# Altium footprint library Integrated Circuits.PcbLib: 142 footprints (part 9 of 9)
Each footprint in its own frame and in the unit in brackets; x right, y up, seen from the top. Pads: shape width x height; smd on the part's side, far side on the other; paste and mask are expansions set on the pad; w line width, h text height; cw(c..) or ccw(c..) is an arc to the next point about the centre after c.
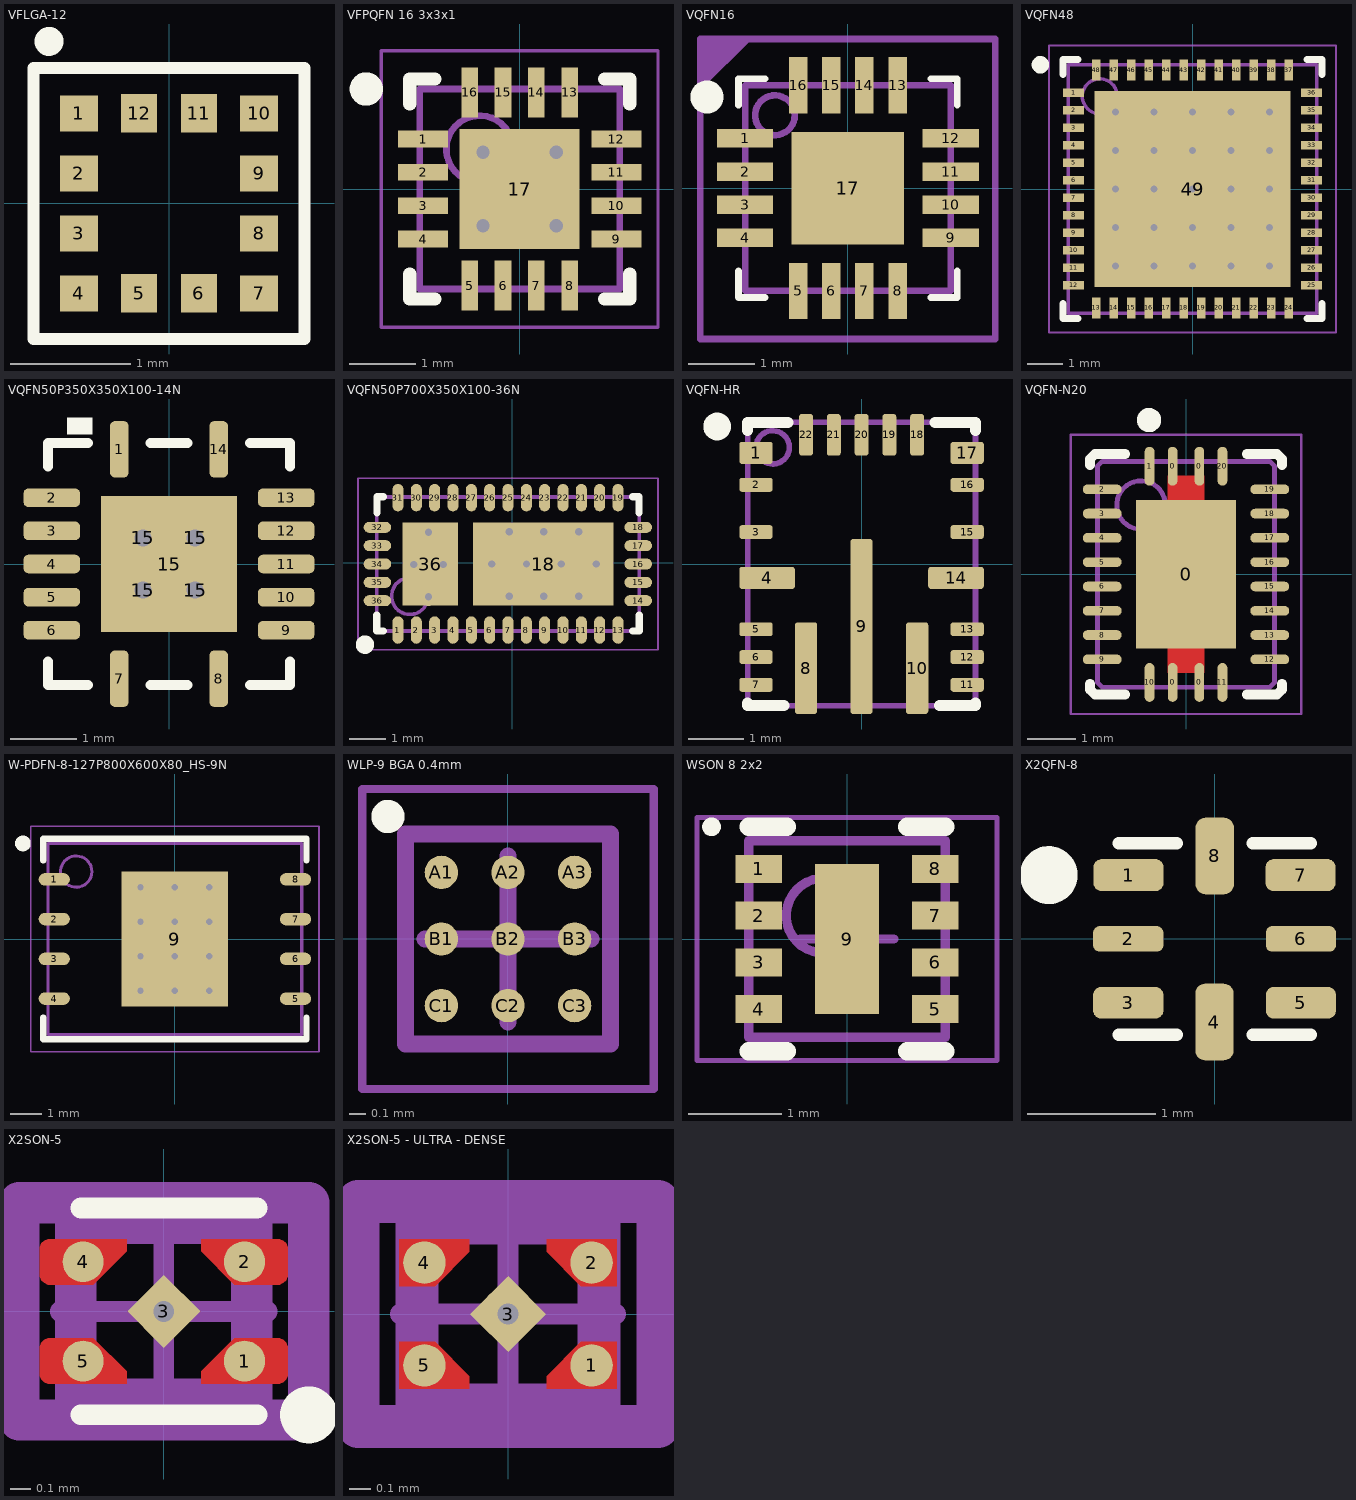
[diagram p8: the footprints below, top view; thin cyan lines are the x and y axes]

## VFLGA-12 [mm] "SENSOR MAGMTR I2C/SPI 12LGA"
height 1
pads (12):
  rect 0.32x0.3 smd: 1(-0.75,0.75) 2(-0.75,0.25) 3(-0.75,-0.25) 4(-0.75,-0.75) 7(0.75,-0.75) 8(0.75,-0.25) 9(0.75,0.25) 10(0.75,0.75)
  rect 0.3x0.32 smd: 5(-0.25,-0.75) 6(0.25,-0.75) 11(0.25,0.75) 12(-0.25,0.75)
Top Overlay:
  circle w0.2: c-1,1.35 r0.02
  lines w0.1: -1.13,-1.13 1.13,-1.13 1.13,1.13 -1.13,1.13 -1.13,-1.13
3D body: height 1, standoff 0, extent -1.075,-1.075 1.075,1.075

## VFPQFN 16 3x3x1 [mm] "STSPIN233"
height 1
pads (17):
  rect 0.75x0.25 smd: 1(-1.45,0.75) 2(-1.45,0.25) 3(-1.45,-0.25) 4(-1.45,-0.75) 9(1.45,-0.75) 10(1.45,-0.25) 11(1.45,0.25) 12(1.45,0.75)
  rect 0.25x0.75 smd: 5(-0.75,-1.45) 6(-0.25,-1.45) 7(0.25,-1.45) 8(0.75,-1.45) 13(0.75,1.45) 14(0.25,1.45) 15(-0.25,1.45) 16(-0.75,1.45)
  rect 1.8x1.8 smd: 17(0,0)
via 0.55,-0.55 diameter 0.5 hole 0.2
via -0.55,-0.55 diameter 0.5 hole 0.2
via 0.55,0.55 diameter 0.5 hole 0.2
via -0.55,0.55 diameter 0.5 hole 0.2
Top Overlay:
  circle w0.25: c-2.3,1.5 r0.125
  lines w0.2: -1.65,-1.275 -1.65,-1.65 -1.275,-1.65 ; -1.65,1.275 -1.65,1.65 -1.275,1.65 ; 1.275,-1.65 1.65,-1.65 1.65,-1.275 ; 1.275,1.65 1.65,1.65 1.65,1.275
3D Bodies:
  circle w0.1: c-0.6,0.6 r0.5
  lines w0.1: -1.5,-1.5 1.5,-1.5 1.5,1.5 -1.5,1.5 -1.5,-1.5
Mechanical 15:
  lines w0.05: -2.075,-2.075 2.075,-2.075 2.075,2.075 -2.075,2.075 -2.075,-2.075
  lines w0.1: -0.5,0 0.5,0 ; 0,-0.5 0,0.5
3D body: height 1, standoff 0, extent -1.5,-1.5 1.5,1.5

## VQFN16 [mm] "16 pin QFN with thermal pad, 3x3mm"
pads (17):
  rect 0.85x0.28 smd: 1(-1.55,0.75) 2(-1.55,0.25) 3(-1.55,-0.25) 4(-1.55,-0.75) 9(1.55,-0.75) 10(1.55,-0.25) 11(1.55,0.25) 12(1.55,0.75)
  rect 0.28x0.85 smd: 5(-0.75,-1.55) 6(-0.25,-1.55) 7(0.25,-1.55) 8(0.75,-1.55) 13(0.75,1.55) 14(0.25,1.55) 15(-0.25,1.55) 16(-0.75,1.55)
  rect 1.7x1.7 smd paste-1: 17(0,0)
Top Overlay:
  circle w0.25: c-2.125,1.375 r0.125
  lines w0.1: -1.65,-1.25 -1.65,-1.65 -1.25,-1.65 ; -1.65,1.25 -1.65,1.65 -1.25,1.65 ; 1.25,-1.65 1.65,-1.65 1.65,-1.25 ; 1.25,1.65 1.65,1.65 1.65,1.25
Top Paste:
  region: 0.8,0.8 0.1,0.8 0.1,0.1 0.8,0.1
  region: -0.1,0.8 -0.8,0.8 -0.8,0.1 -0.1,0.1
  region: -0.1,-0.1 -0.8,-0.1 -0.8,-0.8 -0.1,-0.8
  region: 0.8,-0.1 0.1,-0.1 0.1,-0.8 0.8,-0.8
Top Assy Drawing:
  region: -2.2,1.5 -1.45,2.25 -2.2,2.25
3D Bodies:
  circle w0.1: c-1.1,1.1 r0.3
  lines w0.1: -1.55,-1.55 1.55,-1.55 1.55,1.55 -1.55,1.55 -1.55,-1.55
Mechanical 15:
  lines w0.1: -0.5,0 0.5,0 ; 0,-0.5 0,0.5 ; -2.225,-2.275 2.225,-2.275 2.225,2.25 -2.225,2.25 -2.225,-2.275
  text ".Designator" at -1.956,-0.279 h0.38
3D body "QFN50P300X300X100_HS-17N.step": height 1, standoff 0, extent -1.6,-1.6 1.6,1.6

## VQFN48 [mm] "VQFN, 48-Leads, 7.00x7.00mm, Pitch 0.50mm"
height 1
pads (49):
  rect 0.6x0.24 smd: 1(-3.4,2.75) 2(-3.4,2.25) 3(-3.4,1.75) 4(-3.4,1.25) 5(-3.4,0.75) 6(-3.4,0.25) 7(-3.4,-0.25) 8(-3.4,-0.75) 9(-3.4,-1.25) 10(-3.4,-1.75) 11(-3.4,-2.25) 12(-3.4,-2.75) 25(3.4,-2.75) 26(3.4,-2.25) 27(3.4,-1.75) 28(3.4,-1.25) 29(3.4,-0.75) 30(3.4,-0.25) 31(3.4,0.25) 32(3.4,0.75) 33(3.4,1.25) 34(3.4,1.75) 35(3.4,2.25) 36(3.4,2.75)
  rect 0.24x0.6 smd: 13(-2.75,-3.4) 14(-2.25,-3.4) 15(-1.75,-3.4) 16(-1.25,-3.4) 17(-0.75,-3.4) 18(-0.25,-3.4) 19(0.25,-3.4) 20(0.75,-3.4) 21(1.25,-3.4) 22(1.75,-3.4) 23(2.25,-3.4) 24(2.75,-3.4) 37(2.75,3.4) 38(2.25,3.4) 39(1.75,3.4) 40(1.25,3.4) 41(0.75,3.4) 42(0.25,3.4) 43(-0.25,3.4) 44(-0.75,3.4) 45(-1.25,3.4) 46(-1.75,3.4) 47(-2.25,3.4) 48(-2.75,3.4)
  rect 5.6x5.6 smd: 49(0,0)
via 2.2,-2.2 diameter 0.5 hole 0.2
via 1.1,-2.2 diameter 0.5 hole 0.2
via 0,-2.2 diameter 0.5 hole 0.2
via -1.1,-2.2 diameter 0.5 hole 0.2
via -2.2,-2.2 diameter 0.5 hole 0.2
via 2.2,-1.1 diameter 0.5 hole 0.2
via 1.1,-1.1 diameter 0.5 hole 0.2
via 0,-1.1 diameter 0.5 hole 0.2
via -1.1,-1.1 diameter 0.5 hole 0.2
via -2.2,-1.1 diameter 0.5 hole 0.2
via 2.2,0 diameter 0.5 hole 0.2
via 1.1,0 diameter 0.5 hole 0.2
via 0,0 diameter 0.5 hole 0.2
via -1.1,0 diameter 0.5 hole 0.2
via -2.2,0 diameter 0.5 hole 0.2
via 2.2,1.1 diameter 0.5 hole 0.2
via 1.1,1.1 diameter 0.5 hole 0.2
via 0,1.1 diameter 0.5 hole 0.2
via -1.1,1.1 diameter 0.5 hole 0.2
via -2.2,1.1 diameter 0.5 hole 0.2
via 2.2,2.2 diameter 0.5 hole 0.2
via 1.1,2.2 diameter 0.5 hole 0.2
via 0,2.2 diameter 0.5 hole 0.2
via -1.1,2.2 diameter 0.5 hole 0.2
via -2.2,2.2 diameter 0.5 hole 0.2
Top Overlay:
  circle w0.25: c-4.35,3.55 r0.125
  lines w0.2: -3.7,-3.27 -3.7,-3.7 -3.27,-3.7 ; -3.7,3.27 -3.7,3.7 -3.27,3.7 ; 3.27,-3.7 3.7,-3.7 3.7,-3.27 ; 3.27,3.7 3.7,3.7 3.7,3.27
3D Bodies:
  circle w0.1: c-2.65,2.65 r0.5
  lines w0.1: -3.55,-3.55 3.55,-3.55 3.55,3.55 -3.55,3.55 -3.55,-3.55
Mechanical 15:
  lines w0.05: -4.1,-4.1 4.1,-4.1 4.1,4.1 -4.1,4.1 -4.1,-4.1
  lines w0.1: -0.5,0 0.5,0 ; 0,-0.5 0,0.5
3D body "VQFN48.step": height 1, standoff 0, extent -3.551,-3.551 3.551,3.551

## VQFN50P350X350X100-14N [mm] "VQFN, 14-Leads, Body 3.50x3.50mm, Pitch 0.50mm, IPC Medium Density"
pads (19):
  rrect50% 0.28x0.85 smd paste-0.412: 1(-0.75,1.731) 7(-0.75,-1.731) 8(0.75,-1.731) 14(0.75,1.731)
  rrect50% 0.85x0.28 smd paste-0.412: 2(-1.769,1) 3(-1.769,0.5) 4(-1.769,0) 5(-1.769,-0.5) 6(-1.769,-1) 9(1.769,-1) 10(1.769,-0.5) 11(1.769,0) 12(1.769,0.5) 13(1.769,1)
  round 0.508 / inner round 1.524 / far side round 0.508 hole 0.254: 15(-0.394,-0.394) 15(-0.394,0.394) 15(0.394,0.394)
  rect 2.05x2.05 smd paste-1.012 mask-1.016: 15(0,0)
  round 0.508 hole 0.254: 15(0.394,-0.394)
Top Layer:
  region: 0,-1.025
  region: 0,1.025
Top Overlay:
  region: -1.156,2.21 -1.156,1.956 -1.537,1.956 -1.537,2.21
  lines w0.152: -1.825,-1.473 -1.825,-1.825 -1.223,-1.825 ; -1.825,1.473 -1.825,1.825 -1.223,1.825 ; -0.277,-1.825 0.277,-1.825 ; -0.277,1.825 0.277,1.825 ; 1.223,-1.825 1.825,-1.825 1.825,-1.473 ; 1.223,1.825 1.825,1.825 1.825,1.473
Top Paste:
  drawing of 27 lines, arcs and shapes, not listed
Top Solder:
  region: 0.594,-1.088 0.594,1.088 1.088,1.088 1.088,-1.088
  region: 0.194,-1.088 0.194,1.088 -0.194,1.088 -0.194,-1.088
  region: -1.088,-1.088 -1.088,1.088 -0.594,1.088 -0.594,-1.088
  region: -1.088,-1.088 -1.088,-0.594 1.088,-0.594 1.088,-1.088
  region: -1.088,-0.194 -1.088,0.194 1.088,0.194 1.088,-0.194
  region: -1.088,0.594 -1.088,1.088 1.088,1.088 1.088,0.594
  region: 0,-1.025
  region: 0,1.025
  region: -0.54,2.226 -0.96,2.226 -0.96,1.236 -0.54,1.236
  region: 0.96,2.226 0.54,2.226 0.54,1.236 0.96,1.236
  region: 2.264,1.21 1.274,1.21 1.274,0.79 2.264,0.79
  region: 2.264,0.71 1.274,0.71 1.274,0.29 2.264,0.29
  region: 2.264,0.21 1.274,0.21 1.274,-0.21 2.264,-0.21
  region: 2.264,-0.29 1.274,-0.29 1.274,-0.71 2.264,-0.71
  region: 2.264,-0.79 1.274,-0.79 1.274,-1.21 2.264,-1.21
  region: 0.96,-1.236 0.54,-1.236 0.54,-2.226 0.96,-2.226
  region: -0.54,-1.236 -0.96,-1.236 -0.96,-2.226 -0.54,-2.226
  region: -1.274,-0.79 -2.264,-0.79 -2.264,-1.21 -1.274,-1.21
  region: -1.274,-0.29 -2.264,-0.29 -2.264,-0.71 -1.274,-0.71
  region: -1.274,0.21 -2.264,0.21 -2.264,-0.21 -1.274,-0.21
  region: -1.274,0.71 -2.264,0.71 -2.264,0.29 -1.274,0.29
  region: -1.274,1.21 -2.264,1.21 -2.264,0.79 -1.274,0.79
3D body "RGY0014A.stp": height 0.97, standoff 0, extent -1.769,-1.731 1.731,1.769

## VQFN50P700X350X100-36N [mm] "VQFN, 36-Leads, Body 7.00x3.50mm, Pitch 0.50mm, IPC Medium Density"
height 1
pads (38):
  oval 0.3x0.75 smd: 1(-3.116,-1.834) 2(-2.616,-1.834) 3(-2.116,-1.834) 4(-1.616,-1.834) 5(-1.116,-1.834) 6(-0.616,-1.834) 7(-0.116,-1.834) 8(0.384,-1.834) 9(0.884,-1.834) 10(1.384,-1.834) 11(1.884,-1.834) 12(2.384,-1.834) 13(2.884,-1.834) 19(2.884,1.776) 20(2.384,1.776) 21(1.884,1.776) 22(1.384,1.776) 23(0.884,1.776) 24(0.384,1.776) 25(-0.116,1.776) 26(-0.616,1.776) 27(-1.116,1.776) 28(-1.616,1.776) 29(-2.116,1.776) 30(-2.616,1.776) 31(-3.116,1.776)
  oval 0.75x0.3 smd: 14(3.434,-1.034) 15(3.434,-0.534) 16(3.434,-0.034) 17(3.434,0.466) 18(3.434,0.966) 32(-3.676,0.966) 33(-3.676,0.466) 34(-3.676,-0.034) 35(-3.676,-0.534) 36(-3.676,-1.034)
  rect 3.836x2.25 smd paste+0 mask+0: 18(0.841,-0.034)
  rect 1.514x2.25 smd paste+0 mask+0: 36(-2.234,-0.034)
via -0.087,-0.909 diameter 0.508 hole 0.203
via -0.087,0.841 diameter 0.508 hole 0.203
via 0.863,0.841 diameter 0.508 hole 0.203
via 0.863,-0.909 diameter 0.508 hole 0.203
via 1.813,0.841 diameter 0.508 hole 0.203
via 1.813,-0.909 diameter 0.508 hole 0.203
via 2.288,-0.034 diameter 0.508 hole 0.203
via 1.338,-0.034 diameter 0.508 hole 0.203
via 0.388,-0.034 diameter 0.508 hole 0.203
via -0.562,-0.034 diameter 0.508 hole 0.203
via -1.884,-0.048 diameter 0.508 hole 0.203
via -2.684,-0.048 diameter 0.508 hole 0.203
via -2.284,0.827 diameter 0.508 hole 0.203
via -2.284,-0.923 diameter 0.508 hole 0.203
Top Overlay:
  circle w0.25: c-4.016,-2.234 r0.125
  lines w0.2: -3.696,-1.434 -3.696,-1.859 -3.516,-1.859 ; -3.686,1.366 -3.686,1.796 -3.516,1.796 ; 3.284,-1.859 3.459,-1.859 3.459,-1.434 ; 3.284,1.796 3.454,1.796 3.454,1.366
3D Bodies:
  circle w0.1: c-2.791,-0.909 r0.5
  lines w0.1: -3.691,-1.859 -3.691,1.791 3.459,1.791 3.459,-1.859 -3.691,-1.859
Mechanical 15:
  lines w0.05: -4.206,-2.374 -4.206,2.306 3.974,2.306 3.974,-2.374 -4.206,-2.374
  lines w0.1: -0.616,-0.034 0.384,-0.034 ; -0.116,-0.534 -0.116,0.466
3D body: height 1, standoff 0, extent -3.741,-1.859 3.409,1.791

## VQFN-HR [mm] "LMS3635AQRNLRQ1"
height 0.9
pads (22):
  rrect25% 0.6x0.4 smd paste+0: 1(-1.9,2) 17(1.9,2)
  rrect40% 0.6x0.25 smd paste+0: 2(-1.9,1.425) 3(-1.9,0.575) 5(-1.9,-1.175) 6(-1.9,-1.675) 7(-1.9,-2.175) 11(1.9,-2.175) 12(1.9,-1.675) 13(1.9,-1.175) 15(1.9,0.575) 16(1.9,1.425)
  rrect25% 1x0.4 smd paste-0.2: 4(-1.7,-0.25) 14(1.7,-0.25)
  rrect25% 0.4x1.65 smd paste-0.2: 8(-1,-1.875) 10(1,-1.875)
  rrect25% 0.4x3.15 smd paste-0.2: 9(0,-1.125)
  rrect40% 0.25x0.75 smd paste+0: 18(1,2.325) 19(0.5,2.325) 20(0,2.325) 21(-0.5,2.325) 22(-1,2.325)
Top Overlay:
  circle w0.25: c-2.6,2.475 r0.125
  lines w0.2: -2.05,-2.5 -2.05,-2.55 -1.4,-2.55 ; -2.05,2.4 -2.05,2.55 -1.325,2.55 ; 1.325,2.55 2.05,2.55 2.05,2.4 ; 1.4,-2.55 2.05,-2.55 2.05,-2.5
Top Paste:
  drawing of 12 lines, arcs and shapes, not listed
Top Assy Drawing:
  circle w0.1: c-1.6,2.1 r0.3
  lines w0.1: -2.05,-2.55 -2.05,2.55 2.05,2.55 2.05,-2.55 -2.05,-2.55
  text ".Designator" at -1.95,-0.291 h0.38
Top Dimensions and Assy Info:
  lines w0.05: -1.825,-0.25 -1.575,-0.25 ; -1.7,-0.375 -1.7,-0.125 ; -1.125,-1.875 -0.875,-1.875 ; -1,-2 -1,-1.75 ; -0.125,-1.955 0.125,-1.955 ; -0.125,-1.125 0.125,-1.125 ; -0.125,-0.295 0.125,-0.295 ; 0,-2.08 0,-1.83 ; 0,-1.25 0,-1 ; 0,-0.42 0,-0.17 ; 0.875,-1.875 1.125,-1.875 ; 1,-2 1,-1.75 ; 1.575,-0.25 1.825,-0.25 ; 1.7,-0.375 1.7,-0.125
  text "Vias at crosses 0.2 mm diameter recommended" at -2,-4 h0.25
3D body: height 0.9, standoff 0, extent -2.05,-2.55 2.05,2.55

## VQFN-N20 [mm]
height 0.8
pads (25):
  oval 0.2x0.8 smd: 0(-0.275,-2.225) 0(-0.275,2.225) 0(0.275,-2.225) 0(0.275,2.225) 1(-0.75,2.225) 10(-0.75,-2.225) 11(0.75,-2.225) 20(0.75,2.225)
  rect 2.05x3.05 smd paste-10: 0(0,0)
  oval 0.8x0.2 smd: 2(-1.725,1.75) 3(-1.725,1.25) 4(-1.725,0.75) 5(-1.725,0.25) 6(-1.725,-0.25) 7(-1.725,-0.75) 8(-1.725,-1.25) 9(-1.725,-1.75) 12(1.725,-1.75) 13(1.725,-1.25) 14(1.725,-0.75) 15(1.725,-0.25) 16(1.725,0.25) 17(1.725,0.75) 18(1.725,1.25) 19(1.725,1.75)
Top Layer:
  rectangle: -0.381,-2.032 0.381,2.032
Top Overlay:
  circle w0.25: c-0.762,3.175 r0.125
  lines w0.2: -1.975,-2.25 -1.975,-2.375 -1.875,-2.475 -1.25,-2.475 ; -1.975,2.25 -1.975,2.375 -1.875,2.475 -1.25,2.475 ; 1.25,-2.475 1.875,-2.475 1.975,-2.375 1.975,-2.25 ; 1.25,2.475 1.875,2.475 1.975,2.375 1.975,2.25
Top Paste:
  region: 0.936,-0.116 0.116,-0.116 0.116,-1.436 0.936,-1.436
  rectangle: -0.97,0.15 -0.15,1.47
  region: -0.15,-0.15 -0.97,-0.15 -0.97,-1.47 -0.15,-1.47
  rectangle: 0.15,0.15 0.97,1.47
Top Solder:
  rectangle: -0.483,-2.032 0.483,2.032
Top Assy Drawing:
  text ".Designator" at -0.673,3.824 h0.51
3D Bodies:
  circle w0.1: c-0.925,1.425 r0.5
  lines w0.1: -1.825,-2.225 -1.825,2.225 -1.725,2.325 1.725,2.325 1.825,2.225 1.825,-2.225 1.725,-2.325 -1.725,-2.325 -1.825,-2.225
Mechanical 15:
  lines w0.05: -2.375,-2.875 2.375,-2.875 2.375,2.875 -2.375,2.875 -2.375,-2.875
  lines w0.1: -0.5,0 0.5,0 ; 0,-0.5 0,0.5
3D body "QFN127P600-8N.step": height 0.8, standoff 0, extent -1.835,-2.335 1.835,2.335

## W-PDFN-8-127P800X600X80_HS-9N [mm] "QFN, 8-Leads, Body 8.00x6.00mm, Pitch 1.27mm, Thermal Pad 3.40x4.30mm, IPC Medium Density"
height 0.8
pads (9):
  oval 1x0.4 smd: 1(-3.85,1.905) 2(-3.85,0.635) 3(-3.85,-0.635) 4(-3.85,-1.905) 5(3.85,-1.905) 6(3.85,-0.635) 7(3.85,0.635) 8(3.85,1.905)
  rect 3.4x4.3 smd: 9(0,0)
via -1.1,1.65 diameter 0.5 hole 0.2
via 0,1.65 diameter 0.5 hole 0.2
via 1.1,1.65 diameter 0.5 hole 0.2
via -1.1,0.55 diameter 0.5 hole 0.2
via 0,0.55 diameter 0.5 hole 0.2
via 1.1,0.55 diameter 0.5 hole 0.2
via -1.1,-0.55 diameter 0.5 hole 0.2
via 0,-0.55 diameter 0.5 hole 0.2
via 1.1,-0.55 diameter 0.5 hole 0.2
via -1.1,-1.65 diameter 0.5 hole 0.2
via 0,-1.65 diameter 0.5 hole 0.2
via 1.1,-1.65 diameter 0.5 hole 0.2
Top Overlay:
  circle w0.25: c-4.85,3.05 r0.125
  lines w0.2: -4.2,-2.505 -4.2,-3.2 0.035,-3.2 ; -4.2,2.505 -4.2,3.2 0.035,3.2 ; -0.035,-3.2 4.2,-3.2 4.2,-2.505 ; -0.035,3.2 4.2,3.2 4.2,2.505
3D Bodies:
  circle w0.1: c-3.15,2.15 r0.5
  lines w0.1: -4.05,-3.05 -4.05,3.05 4.05,3.05 4.05,-3.05 -4.05,-3.05
Mechanical 15:
  lines w0.05: -4.6,-3.6 -4.6,3.6 4.6,3.6 4.6,-3.6 -4.6,-3.6
  lines w0.1: -0.5,0 0.5,0 ; 0,-0.5 0,0.5
3D body "QFN127P800X600X80_HS-9N.step": height 0.8, standoff 0, extent -4.051,-3.05 4.051,3.05

## WLP-9 BGA 0.4mm [mm] "9 PIN WLP BGA MAXIM41400ANL"
height 0.5
pads (9):
  round 0.2 smd: A1(-0.4,0.4) A2(0,0.4) A3(0.4,0.4) B1(-0.4,0) B2(0,0) B3(0.4,0) C1(-0.4,-0.4) C2(0,-0.4) C3(0.4,-0.4)
Top Overlay:
  circle w0.1: c-0.72,0.735 r0.05
3D Bodies:
  lines w0.1: -0.615,-0.63 0.615,-0.63 0.615,0.63 -0.615,0.63 -0.615,-0.63
Mechanical 15:
  lines w0.05: -0.875,-0.9 0.875,-0.9 0.875,0.9 -0.875,0.9 -0.875,-0.9
  lines w0.1: -0.5,0 0.5,0 ; 0,-0.5 0,0.5
3D body "WLP9 - 0.4mm MAX41400 v2.step": height 0.5, standoff 0, extent -0.614,-0.629 0.614,0.629

## WSON 8 2x2 [mm] "DRV8837"
height 0.8
pads (9):
  rect 0.5x0.3 smd: 1(-0.945,0.75) 2(-0.945,0.25) 3(-0.945,-0.25) 4(-0.945,-0.75) 5(0.945,-0.75) 6(0.945,-0.25) 7(0.945,0.25) 8(0.945,0.75)
  rect 0.69x1.6 smd: 9(0,0)
Top Overlay:
  circle w0.1: c-1.45,1.2 r0.05
  lines w0.2: -1.05,-1.2 -0.645,-1.2 ; -1.05,1.2 -0.645,1.2 ; 0.645,-1.2 1.05,-1.2 ; 0.645,1.2 1.05,1.2
3D Bodies:
  circle w0.1: c-0.25,0.25 r0.4
  lines w0.1: -1.05,-1.05 -1.05,1.05 1.05,1.05 1.05,-1.05 -1.05,-1.05
Mechanical 15:
  lines w0.05: -1.605,-1.3 -1.605,1.3 1.605,1.3 1.605,-1.3 -1.605,-1.3
  lines w0.1: -0.5,0 0.5,0 ; 0,-0.5 0,0.5
3D body: height 0.8, standoff 0, extent -1.05,-1.05 1.05,1.05

## X2QFN-8 [mm] "1.5x1.5mm ADS7046"
height 0.4
pads (8):
  rrect50% 0.55x0.25 smd: 1(-0.675,0.5) 3(-0.677,-0.5) 5(0.675,-0.5) 7(0.673,0.5)
  rrect50% 0.55x0.2 smd: 2(-0.677,0) 6(0.675,0)
  rrect50% 0.3x0.6 smd: 4(-0.002,-0.651) 8(0,0.65)
Top Overlay:
  circle w0.254: c-1.3,0.5 r0.1
  lines w0.1: -0.75,-0.75 -0.3,-0.75 ; -0.75,0.75 -0.3,0.75 ; 0.3,-0.75 0.75,-0.75 ; 0.3,0.75 0.75,0.75
3D body "X2QFN-8 ADS7046 v3.step": height 0.4, standoff 0, extent -0.75,-0.75 0.75,0.75

## X2SON-5 [mm] "X2SON-5Pin 0.8x0.8mm TLV9061"
pads (5):
  round 0.198 smd paste+0 mask+0: 1(0.39,-0.24) 2(0.39,0.24) 4(-0.39,0.24) 5(-0.39,-0.24)
  rect 0.25x0.25 smd rot 135 paste-1000 mask+0: 3(0,0)
via 0,0 diameter 0.25 hole 0.1
Top Layer:
  region: -0.18,-0.35 -0.18,-0.29 -0.34,-0.13 -0.55,-0.13 -0.56,-0.13 -0.578,-0.138 -0.592,-0.152 -0.6,-0.17 -0.6,-0.18 -0.6,-0.3 -0.6,-0.31 -0.592,-0.328 -0.578,-0.342 -0.56,-0.35 -0.55,-0.35
  region: -0.18,0.35 -0.18,0.29 -0.34,0.13 -0.55,0.13 -0.56,0.13 -0.578,0.138 -0.592,0.152 -0.6,0.17 -0.6,0.18 -0.6,0.3 -0.6,0.31 -0.592,0.328 -0.578,0.342 -0.56,0.35 -0.55,0.35
  region: 0.18,0.35 0.18,0.29 0.34,0.13 0.55,0.13 0.56,0.13 0.578,0.138 0.592,0.152 0.6,0.17 0.6,0.18 0.6,0.3 0.6,0.31 0.592,0.328 0.578,0.342 0.56,0.35 0.55,0.35
  region: 0.18,-0.35 0.18,-0.29 0.34,-0.13 0.55,-0.13 0.56,-0.13 0.578,-0.138 0.592,-0.152 0.6,-0.17 0.6,-0.18 0.6,-0.3 0.6,-0.31 0.592,-0.328 0.578,-0.342 0.56,-0.35 0.55,-0.35
Top Overlay:
  circle w0.175: c0.7,-0.5 r0.05
  lines w0.1: -0.4,-0.5 0.45,-0.5 ; -0.4,0.5 0.45,0.5
Top Paste:
  region: 0.17,0 0,0.17 -0.17,0 0,-0.17
Bottom 3D Body:
  lines w0.2: -0.425,-0.425 -0.425,0.425 0.425,0.425 0.425,-0.425 -0.425,-0.425
Top Assembly:
  lines w0.2: -0.7,-0.525 -0.7,0.525 0.7,0.525 0.7,-0.525 -0.7,-0.525
Top Component Center:
  lines w0.1: -0.5,0 0.5,0 ; 0,-0.5 0,0.5
Bottom Courtyard:
  lines w0.2: -0.7,-0.525 -0.7,0.525 0.7,0.525 0.7,-0.525 -0.7,-0.525
3D body "IC_Texas_Instruments_TLV9061IDPWR_eec.STEP": height 0.34, standoff -0.01, extent -0.392,-0.401 0.408,0.399

## X2SON-5 - ULTRA - DENSE [mm] "X2SON-5Pin 0.8x0.8mm TLV9061"
pads (5):
  round 0.198 smd paste+0 mask+0: 1(0.39,-0.24) 2(0.39,0.24) 4(-0.39,0.24) 5(-0.39,-0.24)
  rect 0.25x0.25 smd rot 135 paste-1000 mask+0: 3(0,0)
via 0,0 diameter 0.25 hole 0.1
Top Layer:
  region: 0.18,-0.35 0.18,-0.29 0.34,-0.13 0.508,-0.13 0.508,-0.35
  region: -0.18,0.35 -0.18,0.29 -0.34,0.13 -0.508,0.13 -0.508,0.35
  region: 0.18,0.35 0.18,0.29 0.34,0.13 0.508,0.13 0.508,0.35
  region: -0.18,-0.35 -0.18,-0.29 -0.34,-0.13 -0.508,-0.13 -0.508,-0.35
Top Paste:
  region: 0.17,0 0,0.17 -0.17,0 0,-0.17
Bottom 3D Body:
  lines w0.2: -0.425,-0.425 0.425,-0.425 0.425,0.425 -0.425,0.425 -0.425,-0.425
Top Assembly:
  lines w0.2: -0.7,-0.525 0.7,-0.525 0.7,0.525 -0.7,0.525 -0.7,-0.525
Top Component Center:
  lines w0.1: -0.5,0 0.5,0 ; 0,-0.5 0,0.5
Bottom Courtyard:
  lines w0.2: -0.7,-0.525 0.7,-0.525 0.7,0.525 -0.7,0.525 -0.7,-0.525
3D body "IC_Texas_Instruments_TLV9061IDPWR_eec.STEP": height 0.34, standoff -0.01, extent -0.392,-0.401 0.408,0.399